# Altium footprint library Discretes.PcbLib: 81 footprints (part 5 of 6)
Each footprint in its own frame and in the unit in brackets; x right, y up, seen from the top. Pads: shape width x height; smd on the part's side, far side on the other; paste and mask are expansions set on the pad; w line width, h text height; cw(c..) or ccw(c..) is an arc to the next point about the centre after c.
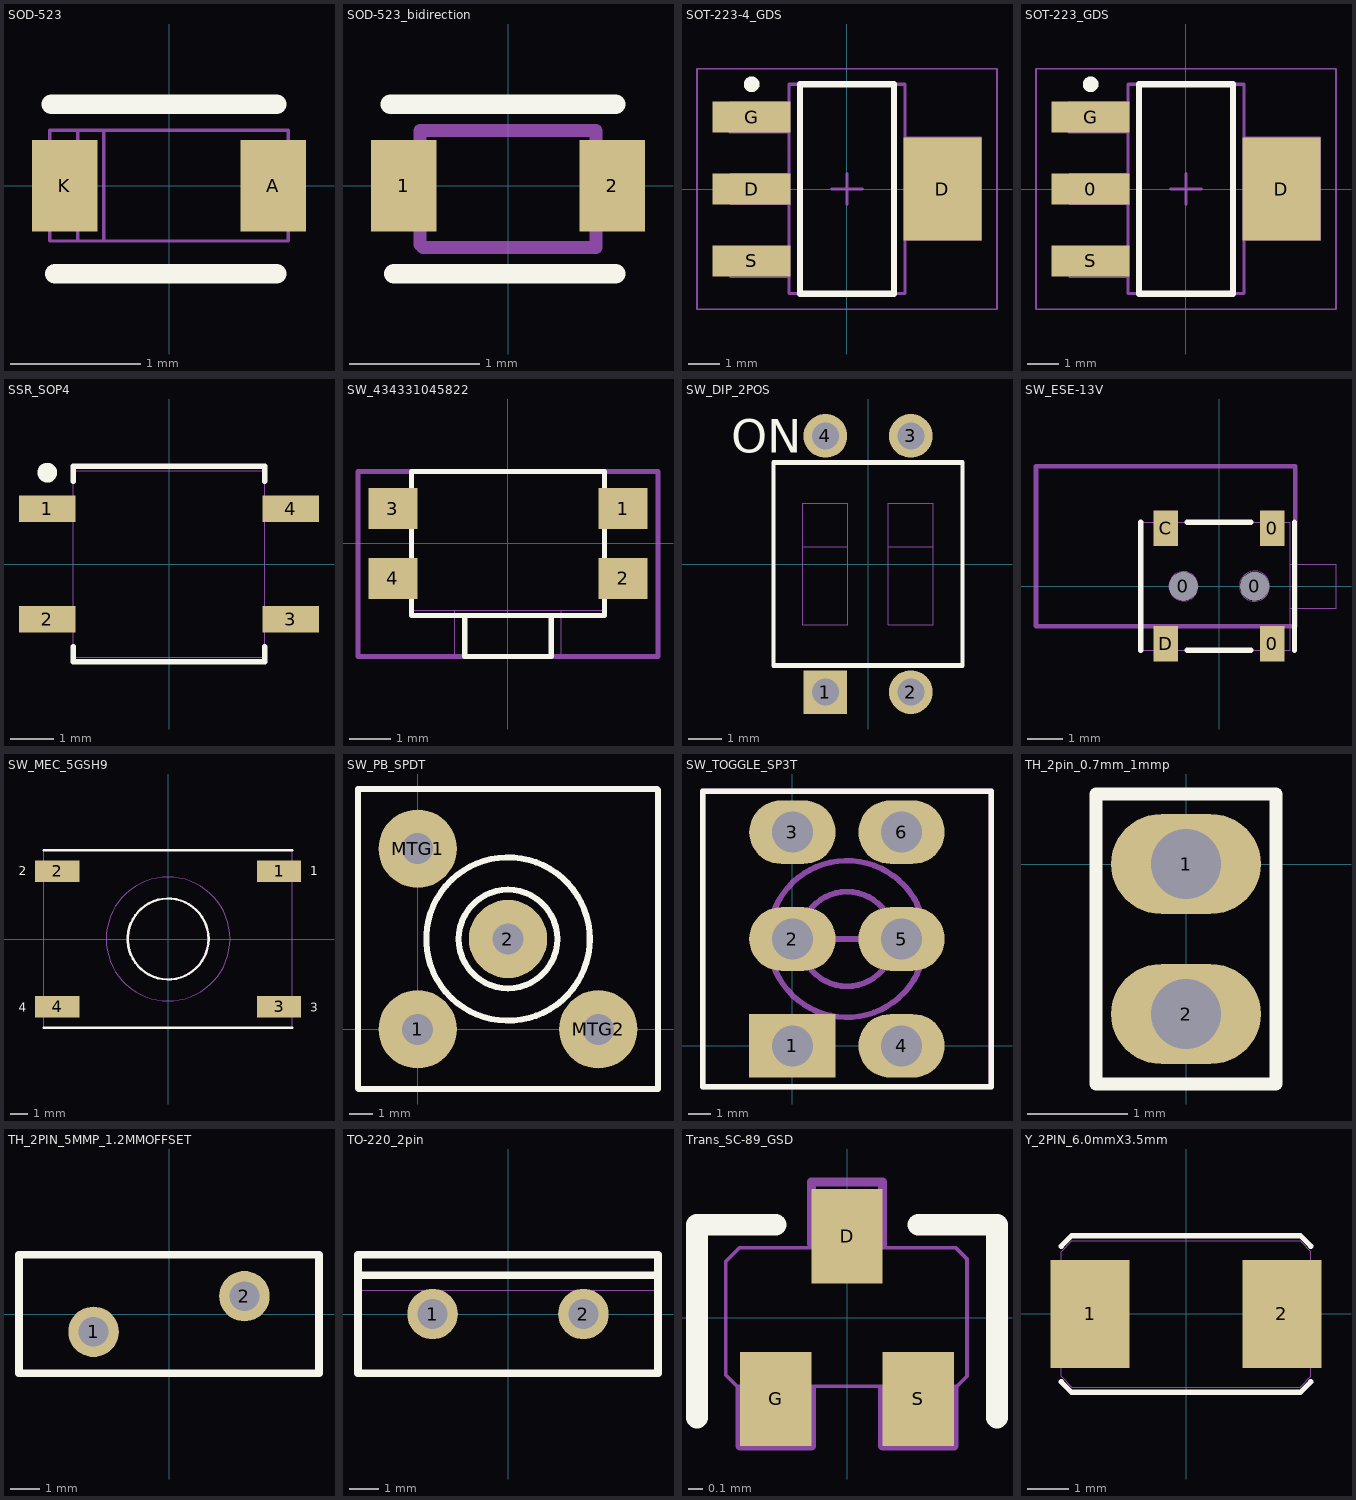
[diagram p4: the footprints below, top view; thin cyan lines are the x and y axes]

## SOD-523 [mm] "SOD-523 Package for diodes"
height 0.7
pads (2):
  rect 0.5x0.7 smd mask+0.06: A(0.8,0) K(-0.8,0)
Top Overlay:
  lines w0.152: -0.9,0.625 0.824,0.625 ; -0.875,-0.675 0.824,-0.675
Mechanical 1:
  lines w0.025: -0.7,-0.424 -0.7,0.425 ; -0.5,-0.424 -0.5,0.425 ; -0.915,-0.424 0.915,-0.424 0.915,0.425 -0.915,0.425 -0.915,-0.424
  text ".Designator" at -0.4,-0.325 h0.64
3D body "SOD523.step": height 0.71, standoff 0, extent -0.915,-0.424 0.915,0.425

## SOD-523_bidirection [mm] "SOD-523 Package for bidirectional TVS diodes"
height 0.7
pads (2):
  rect 0.5x0.7 smd mask+0.06: 1(-0.8,0) 2(0.8,0)
Top Overlay:
  lines w0.152: -0.9,0.625 0.824,0.625 ; -0.875,-0.675 0.824,-0.675
Mechanical 1:
  lines w0.1: -0.675,-0.45 -0.675,0.425 0.675,0.425 0.675,-0.475 -0.65,-0.475 -0.675,-0.45
  text ".Designator" at -0.3,-0.3 h0.64
3D body "SOD523.step": height 0.71, standoff 0, extent -0.915,-0.424 0.915,0.425

## SOT-223-4_GDS [mm] "SOT223, 4-Leads, Body 6.5x3.5mm, Pitch 2.3mm, Lead Span 7mm, IPC Low Density"
height 1.8
pads (4):
  rect 2.5x1 smd: D(-3.05,0) G(-3.05,2.3) S(-3.05,-2.3)
  rect 2.5x3.3 smd: D(3.05,0)
Top Overlay:
  circle w0.25: c-3.05,3.35 r0.125
  lines w0.2: -1.5,-3.35 -1.5,3.35 1.5,3.35 1.5,-3.35 -1.5,-3.35
Mechanical 1:
  lines w0.051: -1.854,2.769 -3.759,2.769 -3.759,1.803 -1.85,1.803 ; -1.829,-1.854 -3.734,-1.854 -3.734,-2.819 -1.825,-2.819 ; -1.829,0.483 -3.734,0.483 -3.734,-0.483 -1.825,-0.483 ; 1.85,-1.626 4.293,-1.626 4.293,1.651 1.854,1.651
  lines w0.1: -1.85,-3.35 -1.85,3.35 1.85,3.35 1.85,-3.35 -1.85,-3.35
  text ".Designator" at -0.254,1.143 h1.02
Mechanical 15:
  lines w0.05: -4.8,-3.85 -4.8,3.85 4.8,3.85 4.8,-3.85 -4.8,-3.85
  lines w0.1: -0.5,0 0.5,0 ; 0,-0.5 0,0.5
3D body: height 1.8, standoff 0.02, extent -1.85,-3.35 1.85,3.35

## SOT-223_GDS [mm] "SOT223, 4-Leads, Body 6.5x3.5mm, Pitch 2.3mm, Lead Span 7mm, IPC Low Density"
height 1.8
pads (4):
  rect 2.5x1 smd: 0(-3.05,0) G(-3.05,2.3) S(-3.05,-2.3)
  rect 2.5x3.3 smd: D(3.05,0)
Top Overlay:
  circle w0.25: c-3.05,3.35 r0.125
  lines w0.2: -1.5,-3.35 -1.5,3.35 1.5,3.35 1.5,-3.35 -1.5,-3.35
Mechanical 1:
  lines w0.051: -1.854,2.769 -3.759,2.769 -3.759,1.803 -1.85,1.803 ; -1.829,-1.854 -3.734,-1.854 -3.734,-2.819 -1.825,-2.819 ; -1.829,0.483 -3.734,0.483 -3.734,-0.483 -1.825,-0.483 ; 1.85,-1.626 4.293,-1.626 4.293,1.651 1.854,1.651
  lines w0.1: -1.85,-3.35 -1.85,3.35 1.85,3.35 1.85,-3.35 -1.85,-3.35
  text ".Designator" at -0.254,1.143 h1.02
Mechanical 15:
  lines w0.05: -4.8,-3.85 -4.8,3.85 4.8,3.85 4.8,-3.85 -4.8,-3.85
  lines w0.1: -0.5,0 0.5,0 ; 0,-0.5 0,0.5
3D body: height 1.8, standoff 0.02, extent -1.85,-3.35 1.85,3.35

## SSR_SOP4 [mm] "Solid State Relay, 4-SOP"
height 2
pads (4):
  rect 1.3x0.6 smd: 1(-2.8,1.27) 2(-2.8,-1.27) 3(2.8,-1.27) 4(2.8,1.27)
Top Overlay:
  circle w0.254: c-2.8,2.1 r0.1
  lines w0.127: 2.2,-1.9 2.2,-2.25 ; 2.2,1.9 2.2,2.25 ; -2.2,-1.9 -2.2,-1.9 ; -2.2,-1.9 -2.2,-2.25 2.2,-2.25 ; -2.2,1.9 -2.2,2.25 2.2,2.25 ; -2.2,1.9 -2.2,1.9 ; 2.2,-2.25 2.2,-2.25 ; 2.2,2.25 2.2,2.25
Mechanical 1:
  lines w0.025: -2.2,-1.5 -3.1,-1.5 -3.1,-1 -2.2,-1 ; -2.2,1 -3.1,1 -3.1,1.5 -2.2,1.5 ; 2.2,-1.5 3.1,-1.5 3.1,-1 2.2,-1 ; 2.2,1 3.1,1 3.1,1.5 2.2,1.5 ; -2.2,-2.15 -2.2,2.15 2.2,2.15 2.2,-2.15 -2.2,-2.15
  text ".Designator" at -1.3,-0.4 h0.79
3D body "4-SOP.STEP": height 2.1, standoff 0, extent -3.4,-2.15 3.4,2.15

## SW_434331045822 [mm] "4.7*3.5mm side push type,SMD, height 1.65mm, black actuator, 220gf, T&R"
height 1.65
pads (4):
  rect 1.2x1 smd: 1(2.8,0.85) 2(2.8,-0.85) 3(-2.8,0.85) 4(-2.8,-0.85)
Top Overlay:
  lines w0.127: 1.05,-1.75 -1.05,-1.75 -1.05,-2.75 1.05,-2.75 1.05,-1.75 ; 1.05,-1.75 2.35,-1.75 2.35,1.75 -2.35,1.75 -2.35,-1.75 1.05,-1.75
Mechanical 1:
  lines w0.025: -2.35,-1.15 -3.2,-1.15 -3.2,-0.533 -2.35,-0.533 ; -2.35,0.533 -3.2,0.533 -3.2,1.15 -2.35,1.15 ; -1.295,-1.63 -1.295,-2.75 -1.3,-2.75 1.3,-2.75 1.3,-1.63 ; 2.35,-1.15 3.2,-1.15 3.2,-0.533 2.35,-0.533 ; 2.35,0.533 3.2,0.533 3.2,1.15 2.35,1.15 ; -2.35,-1.63 2.35,-1.63 2.35,1.749 -2.35,1.749 -2.35,-1.63
  text ".Designator" at -0.7,-0.325 h1
Mechanical 15:
  lines w0.127: -3.65,-2.75 -3.65,1.75 3.65,1.75 3.65,-2.75 -3.65,-2.75
3D body "4343x10458xx.stp": height 1.65, standoff 0, extent -3.2,-2.75 3.2,1.75

## SW_DIP_2POS [mm] "02p, 2.54mm Pitch, Horizontal, IC Type, THT, flat Actuator, black, with Tape, Tube"
height 3.2
pads (4):
  rect 1.3x1.3 hole 0.8: 1(-1.27,-3.81)
  round 1.3 hole 0.8: 2(1.27,-3.81) 3(1.27,3.81) 4(-1.27,3.81)
Top Overlay:
  lines w0.127: -2.81,-3.025 2.81,-3.025 2.81,3.025 -2.81,3.025 -2.81,-3.025 ; -2.81,-3 -2.81,3 2.81,3 2.81,-3 -2.81,-3
  text "ON" at -4.064,3.302 h1
Mechanical 1:
  lines w0.025: -1.94,0.508 -0.6,0.508 ; 0.6,0.508 1.94,0.508 ; -2.81,-3 -2.81,3 2.81,3 2.81,-3 -2.81,-3 ; -1.94,-1.8 -1.94,1.8 -0.6,1.8 -0.6,-1.8 -1.94,-1.8 ; 0.6,-1.8 1.94,-1.8 1.94,1.8 0.6,1.8 0.6,-1.8
  text ".Designator" at -0.762,2.032 h0.64
3D body "418127160902.stp": height 3.65, standoff -3.25, extent -2.76,-3.935 2.76,3.935

## SW_ESE-13V [mm] "Limit Switch, SPST NO OFF-MOM"
pads (6):
  round 0.8 hole 0.8 unplated: 0(-1,0) 0(1,0)
  rect 0.7x1 smd: 0(1.5,-1.625) 0(1.5,1.625) C(-1.5,1.625) D(-1.5,-1.625)
Top Overlay:
  lines w0.15: -2.2,-1.8 -2.2,1.8 ; -0.9,-1.8 0.9,-1.8 ; -0.9,1.8 0.9,1.8 ; 2.125,-1.8 2.125,1.8
Mechanical 1:
  circle w0.025: c1,0 r0.424
  circle w0.025: c-1,0 r0.412
  lines w0.025: 2,-0.625 3.292,-0.625 3.292,0.625 2,0.625 2,0.6 ; -2.2,-1.8 -2.2,1.8 2,1.8 2,-1.8 -2.2,-1.8
  text ".Designator" at -0.4,2.5 h1
Mechanical 15:
  lines w0.127: -5.15,-1.125 -5.15,3.375 2.15,3.375 2.15,-1.125 -5.15,-1.125
3D body "ESE13V01B.step": height 3.06, standoff -0.4, extent -2.2,-1.8 3.293,1.8

## SW_MEC_5GSH9 [mm] "Tactile pushbutton"
pads (4):
  rect 2.5x1.2 smd: 1(6.25,3.81) 2(-6.25,3.81) 3(6.25,-3.81) 4(-6.25,-3.81)
Top Overlay:
  circle w0.127: c0,0 r2.283
  lines w0.127: -7,-5 7,-5 ; -7,5 7,5 ; 7,5 7,5
  text "3" at 8,-4.1 h0.5
  text "4" at -8.4,-4.1 h0.5
  text "2" at -8.4,3.6 h0.5
  text "1" at 8,3.6 h0.5
Mechanical 1:
  text ".Designator" at -4,5.7 h1.52
Mechanical 13:
  circle w0.025: c0,0 r2.236
  circle w0.025: c0,0 r3.489
  lines w0.025: -7,-5 7,-5 7,5 -7,5 -7,-5
3D body "5GSH9XX LED.stp": height 8.39, standoff 0, extent -7,-5 7,5

## SW_PB_SPDT [mm] "Pushbutton SPDT Switch OFF-(ON)"
height 0.56
pads (4):
  round 3.3 hole 1.3: 1(0,0) 2(3.81,3.81) MTG1(0,7.62) MTG2(7.62,0)
Top Overlay:
  circle w0.254: c3.81,3.81 r2.08
  circle w0.254: c3.81,3.81 r3.447
  lines w0.254: -2.515,-2.5 -2.5,-2.515 10.135,-2.515 10.135,10.1 10.1,10.135 -2.515,10.135 -2.515,-2.5
Mechanical 1:
  circle w0.025: c3.81,3.81 r3.447
  circle w0.025: c3.81,3.81 r2.08
  circle w0.025: c0,0 r0.9
  circle w0.025: c3.811,3.809 r0.9
  lines w0.025: -2.515,-2.515 10.135,-2.515 10.135,10.135 -2.515,10.135 -2.515,-2.515
  text ".Designator" at -0.9,11.2 h1.52
  text "1" at 1.9,-1.9 h1.52
  text "2" at 6.025,3.125 h1.52
3D body "1241.1022.STEP": height 7.75, standoff -3.2, extent -2.515,-2.515 10.135,10.135

## SW_TOGGLE_SP3T [mm] "Toggle Switch SPDT TH"
height 0.56
pads (6):
  rect 3.8x2.8 hole 1.8: 1(0,0)
  oval 3.8x2.8 hole 1.8: 2(0,4.699) 3(0,9.398) 4(4.801,0) 5(4.801,4.699) 6(4.801,9.398)
Top Overlay:
  lines w0.254: -3.949,-1.803 8.751,-1.803 8.751,11.202 -3.949,11.202 -3.949,-1.803
Mechanical 1:
  circle w0.025: c4.801,9.398 r0.9
  circle w0.025: c0,9.398 r0.9
  circle w0.025: c0,4.699 r0.9
  circle w0.025: c4.801,4.699 r0.9
  circle w0.025: c4.801,0 r0.9
  circle w0.025: c0,0 r0.9
  circle w0.254: c2.4,4.699 r2.08
  circle w0.254: c2.4,4.699 r3.447
  lines w0.254: 0,4.699 4.801,4.699 ; -3.949,-1.803 -3.949,11.202 8.751,11.202 8.751,-1.803 -3.949,-1.803
  text "3" at -2.7,8.598 h1.52
  text "2" at -2.7,3.899 h1.52
  text "4" at 7,-0.698 h1.52
  text "5" at 7,4.001 h1.52
  text "6" at 7,8.7 h1.52
  text "1" at -2.7,-0.8 h1.52
  text ".Designator" at -2.1,12 h1.52
3D body "M2024SS1W03-BA_2_03.stp": height 33.63, standoff -4.8, extent -3.949,-1.803 8.751,11.202

## TH_2pin_0.7mm_1mmp [mm] "Through Hole Part, 2pin, 0.7mm dia, 1mmP"
pads (2):
  oval 1.5x1 hole 0.7: 1(0,0) 2(0,-1.5)
Top Overlay:
  lines w0.127: -0.9,-2.2 -0.9,0.7 0.9,0.7 0.9,-2.2 -0.9,-2.2
Mechanical 1:
  circle w0.025: c0,-1.5 r0.35
  circle w0.025: c0,0 r0.35
  lines w0.025: -0.9,-2.2 -0.9,0.7 0.9,0.7 0.9,-2.2 -0.9,-2.2
  text ".Designator" at -0.4,0.9 h0.64

## TH_2PIN_5MMP_1.2MMOFFSET [mm] "2pin through hole WITH 1.2MM OFFSET"
pads (2):
  round 1.7 hole 1: 1(-2.54,-0.6) 2(2.54,0.6)
Top Overlay:
  lines w0.254: -5.05,-2 5.05,-2 5.05,2 -5.05,2 -5.05,-2
Mechanical 1:
  circle w0.025: c2.55,0.6 r0.35
  circle w0.025: c-2.55,-0.6 r0.35
  lines w0.025: -5.05,0 -5.05,-2 5.05,-2 5.05,2 ; -5.05,0.8 -5.05,2 5.05,2 ; 5.05,0.8 5.05,2
  text ".Designator" at -1.3,-0.3 h0.64
Mechanical 13:
  lines w0.025: -5.05,0 -5.05,2

## TO-220_2pin [mm] "TO220 2pin through hole"
pads (2):
  round 1.7 hole 1: 1(-2.54,0) 2(2.54,0)
Top Overlay:
  lines w0.254: -5,1.3 5.05,1.3 ; -5.05,-2 5.05,-2 5.05,2 -5.05,2 -5.05,-2
Mechanical 1:
  circle w0.025: c2.54,0 r0.35
  circle w0.025: c-2.54,0 r0.35
  lines w0.025: -5.05,0 -5.05,-2 5.05,-2 5.05,2 ; 5.05,2 5.05,0.8 -5.05,0.8 -5.05,2 5.05,2
  text ".Designator" at -1.3,-0.3 h0.64
Mechanical 13:
  lines w0.025: -5.05,0 -5.05,2

## Trans_SC-89_GSD [mm] "Transistor P-Channel SC89 Package"
height 1.194
pads (3):
  rect 0.5x0.66 smd: D(0,0.57) G(-0.5,-0.57) S(0.5,-0.57)
Top Overlay:
  lines w0.152: -1.05,-0.7 -1.05,0.65 -0.5,0.65 ; 0.5,0.65 1.05,0.65 1.05,-0.7
Mechanical 1:
  lines w0.025: -0.85,-0.4 -0.77,-0.48 0.77,-0.48 0.84,-0.41 0.84,0.41 0.76,0.49 -0.75,0.49 -0.85,0.39 -0.85,-0.4
  lines w0.064: -0.75,-0.5 -0.75,-0.9 -0.25,-0.9 -0.25,-0.5 ; -0.25,0.52 -0.25,0.95 0.25,0.95 0.25,0.51 ; 0.25,-0.5 0.25,-0.9 0.75,-0.9 0.75,-0.5
  text ".Designator" at -0.45,1.15 h0.79
3D body "SC89.step": height 0.78, standoff 0, extent -0.85,-0.85 0.85,0.85

## Y_2PIN_6.0mmX3.5mm [mm] "Crystal 2 Pin SMD Package"
height 1.4
pads (2):
  rect 1.9x2.6 smd: 1(-2.3,0) 2(2.3,0)
Top Overlay:
  lines w0.127: -2.997,-1.626 -2.743,-1.88 2.743,-1.88 2.997,-1.626 ; -2.997,1.625 -2.743,1.88 2.743,1.88 2.997,1.625
Mechanical 1:
  lines w0.025: -2.997,-1.499 -2.997,-0.394 -2.794,-0.394 -2.794,0.394 -2.997,0.394 -2.997,1.498 -2.743,1.753 2.743,1.753 2.997,1.498 2.997,0.394 2.794,0.394 2.794,-0.394 2.997,-0.394 2.997,-1.499 2.743,-1.753 -2.743,-1.753 -2.997,-1.499
  text ".Designator" at -1.8,1.975 h1
3D body "Abracon_ABM7.STEP": height 1.4, standoff 0, extent -2.997,-1.752 2.997,1.753